# Altium footprint library ref-packages.PCBLIB: 1543 footprints (part 1 of 103)
Each footprint in its own frame and in the unit in brackets; x right, y up, seen from the top. Pads: shape width x height; smd on the part's side, far side on the other; paste and mask are expansions set on the pad; w line width, h text height; cw(c..) or ccw(c..) is an arc to the next point about the centre after c.
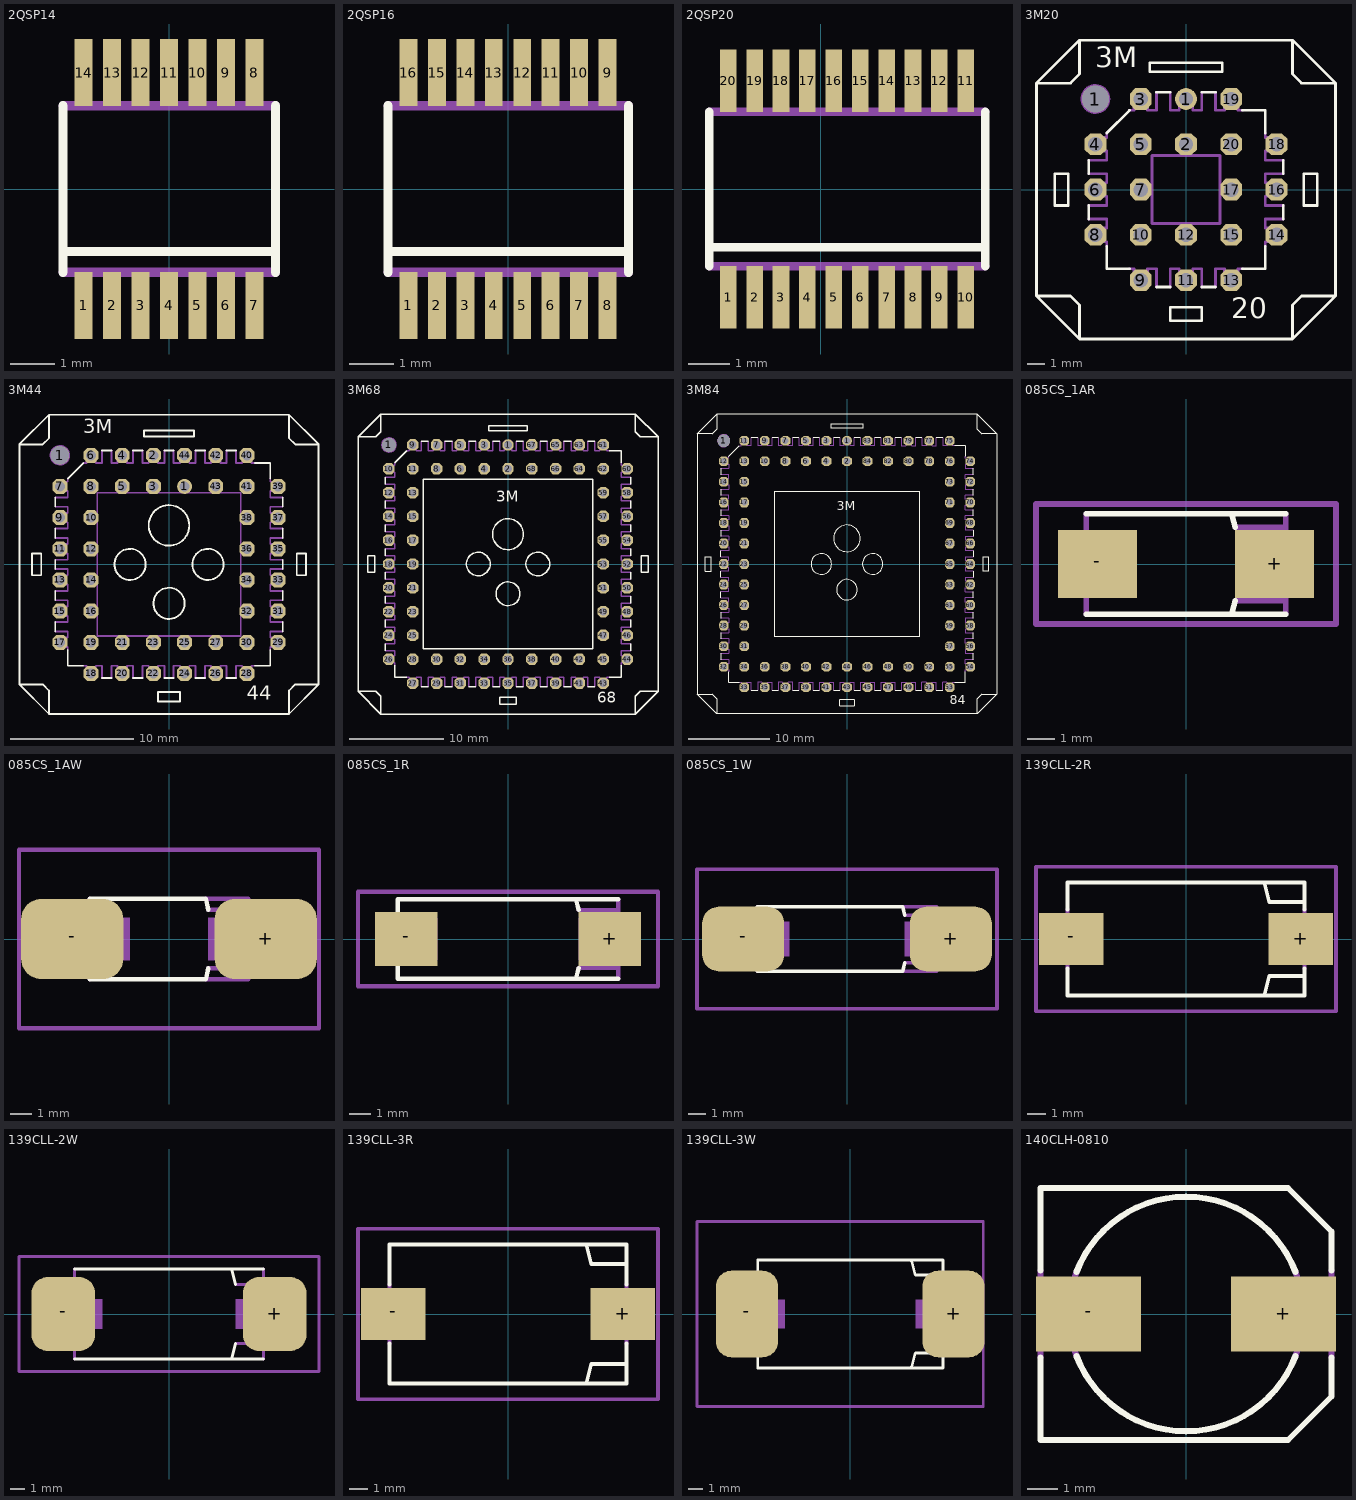
[diagram p0: the footprints below, top view; thin cyan lines are the x and y axes]

## 2QSP14 [mil]
pads (14):
  rect 15.75x59.06 smd: 1(-75,-102.36) 2(-50,-102.36) 3(-25,-102.36) 4(0,-102.36) 5(25,-102.36) 6(50,-102.36) 7(75,-102.36) 8(75,102.36) 9(50,102.36) 10(25,102.36) 11(0,102.36) 12(-25,102.36) 13(-50,102.36) 14(-75,102.36)
Top Overlay:
  lines w8: -93.11,-73.23 -93.11,73.23 ; -88.58,-55.12 90.55,-55.12 ; 93.5,-73.23 93.5,73.23
Mechanical 16:
  rectangle: -80.91,-122.05 -69.09,-74.8
  rectangle: -55.91,-122.05 -44.09,-74.8
  rectangle: -30.91,-122.05 -19.09,-74.8
  rectangle: -5.91,-122.05 5.91,-74.8
  rectangle: 19.09,-122.05 30.91,-74.8
  rectangle: 44.09,-122.05 55.91,-74.8
  rectangle: 69.09,-122.05 80.91,-74.8
  rectangle: 69.09,74.8 80.91,122.05
  rectangle: 44.09,74.8 55.91,122.05
  rectangle: 19.09,74.8 30.91,122.05
  rectangle: -5.91,74.8 5.91,122.05
  rectangle: -30.91,74.8 -19.09,122.05
  rectangle: -55.91,74.8 -44.09,122.05
  rectangle: -80.91,74.8 -69.09,122.05
  lines w8: -93.11,-73.23 93.5,-73.23 ; -93.11,73.23 93.5,73.23

## 2QSP16 [mil]
pads (16):
  rect 15.75x59.06 smd: 1(-87.52,-102.36) 2(-62.52,-102.36) 3(-37.52,-102.36) 4(-12.52,-102.36) 5(12.52,-102.36) 6(37.52,-102.36) 7(62.52,-102.36) 8(87.52,-102.36) 9(87.52,102.36) 10(62.52,102.36) 11(37.52,102.36) 12(12.52,102.36) 13(-12.52,102.36) 14(-37.52,102.36) 15(-62.52,102.36) 16(-87.52,102.36)
Top Overlay:
  lines w8: -105.63,-73.23 -105.63,73.23 ; -101.1,-55.12 103.07,-55.12 ; 106.02,-73.23 106.02,73.23
Mechanical 16:
  rectangle: -93.41,-122.05 -81.59,-74.8
  rectangle: -68.41,-122.05 -56.59,-74.8
  rectangle: -43.41,-122.05 -31.59,-74.8
  rectangle: -18.41,-122.05 -6.59,-74.8
  rectangle: 6.59,-122.05 18.41,-74.8
  rectangle: 31.59,-122.05 43.41,-74.8
  rectangle: 56.59,-122.05 68.41,-74.8
  rectangle: 81.59,-122.05 93.41,-74.8
  rectangle: 81.59,74.8 93.41,122.05
  rectangle: 56.59,74.8 68.41,122.05
  rectangle: 31.59,74.8 43.41,122.05
  rectangle: 6.59,74.8 18.41,122.05
  rectangle: -18.41,74.8 -6.59,122.05
  rectangle: -43.41,74.8 -31.59,122.05
  rectangle: -68.41,74.8 -56.59,122.05
  rectangle: -93.41,74.8 -81.59,122.05
  lines w8: -105.63,-73.23 106.02,-73.23 ; -105.63,73.23 106.02,73.23

## 2QSP20 [mil]
pads (20):
  rect 15.75x59.06 smd: 1(-87.52,-102.36) 2(-62.52,-102.36) 3(-37.52,-102.36) 4(-12.52,-102.36) 5(12.52,-102.36) 6(37.52,-102.36) 7(62.52,-102.36) 8(87.52,-102.36) 9(112.52,-102.36) 10(137.52,-102.36) 11(137.52,102.36) 12(112.52,102.36) 13(87.52,102.36) 14(62.52,102.36) 15(37.52,102.36) 16(12.52,102.36) 17(-12.52,102.36) 18(-37.52,102.36) 19(-62.52,102.36) 20(-87.52,102.36)
Top Overlay:
  lines w8: -105.63,-73.23 -105.63,73.23 ; -101.1,-55.12 153.07,-55.12 ; 156.02,-73.23 156.02,73.23
Mechanical 16:
  rectangle: -93.41,-122.05 -81.59,-74.8
  rectangle: -68.41,-122.05 -56.59,-74.8
  rectangle: -43.41,-122.05 -31.59,-74.8
  rectangle: -18.41,-122.05 -6.59,-74.8
  rectangle: 6.59,-122.05 18.41,-74.8
  rectangle: 31.59,-122.05 43.41,-74.8
  rectangle: 56.59,-122.05 68.41,-74.8
  rectangle: 81.59,-122.05 93.41,-74.8
  rectangle: 106.59,-122.05 118.41,-74.8
  rectangle: 131.59,-122.05 143.41,-74.8
  rectangle: 131.59,74.8 143.41,122.05
  rectangle: 106.59,74.8 118.41,122.05
  rectangle: 81.59,74.8 93.41,122.05
  rectangle: 56.59,74.8 68.41,122.05
  rectangle: 31.59,74.8 43.41,122.05
  rectangle: 6.59,74.8 18.41,122.05
  rectangle: -18.41,74.8 -6.59,122.05
  rectangle: -43.41,74.8 -31.59,122.05
  rectangle: -68.41,74.8 -56.59,122.05
  rectangle: -93.41,74.8 -81.59,122.05
  lines w8: -105.63,-73.23 156.02,-73.23 ; -105.63,73.23 156.02,73.23

## 3M20 [mil]
pads (21):
  round 59 hole 59: 1(-200,200)
  round 48 hole 32: 1(0,200)
  oct 48x48 hole 32: 2(0,100) 3(-100,200) 4(-200,100) 5(-100,100) 6(-200,0) 7(-100,0) 8(-200,-100) 9(-100,-200) 10(-100,-100) 11(0,-200) 12(0,-100) 13(100,-200) 14(200,-100) 15(100,-100) 16(200,0) 17(100,0) 18(200,100) 19(100,200) 20(100,100)
Top Overlay:
  lines w6: -215,-65 -215,-35 ; -215,35 -215,65 ; -175,-125 -175,-175 -125,-175 ; -175,125 -125,175 ; -65,-215 -35,-215 ; -65,215 -35,215 ; 35,-215 65,-215 ; 35,215 65,215 ; 125,-175 175,-175 175,-125 ; 125,175 175,175 175,125 ; 215,-65 215,-35 ; 215,35 215,65 ; -330,-235 -330,235 ; -330,-235 -255,-235 -235,-255 -235,-330 ; -330,-235 -235,-330 ; -330,235 -255,235 -235,255 -235,330 ; -330,235 -235,330 ; -235,-330 235,-330 ; -235,330 235,330 ; 235,-330 235,-255 255,-235 330,-235 ; 235,-330 330,-235 ; 235,330 235,255 255,235 330,235 ; 235,330 330,235 ; 330,-235 330,235 ; -290,-35 -290,35 -260,35 -260,-35 -290,-35 ; -80,260 -80,280 80,280 80,260 -80,260 ; -35,-290 -35,-260 35,-260 35,-290 -35,-290 ; 260,-35 260,35 290,35 290,-35 260,-35
  text "3M" at -200,255 h77.5
  text "20" at 100,-300 h77.5
Mechanical 16:
  circle w6: c-200,200 r30
  lines w6: -215,-65 -175,-65 -175,-85 -215,-85 -215,-115 -175,-115 -175,-125 ; -215,-35 -175,-35 -175,-15 -215,-15 -215,15 -175,15 -175,35 -215,35 ; -215,65 -175,65 -175,85 -215,85 -215,115 -175,115 -175,125 ; -125,-175 -115,-175 -115,-215 -85,-215 -85,-175 -65,-175 -65,-215 ; -125,175 -115,175 -115,215 -85,215 -85,175 -65,175 -65,215 ; -35,-215 -35,-175 -15,-175 -15,-215 15,-215 15,-175 35,-175 35,-215 ; -35,215 -35,175 -15,175 -15,215 15,215 15,175 35,175 35,215 ; 65,-215 65,-175 85,-175 85,-215 115,-215 115,-175 125,-175 ; 65,215 65,175 85,175 85,215 115,215 115,175 125,175 ; 175,-125 175,-115 215,-115 215,-85 175,-85 175,-65 215,-65 ; 175,125 175,115 215,115 215,85 175,85 175,65 215,65 ; 215,-35 175,-35 175,-15 215,-15 215,15 175,15 175,35 215,35 ; -75,-75 75,-75 75,75 -75,75 -75,-75

## 3M44 [mil]
pads (45):
  round 59 hole 59: 1(-350,350)
  round 48 hole 32: 1(50,250)
  oct 48x48 hole 32: 2(-50,350) 3(-50,250) 4(-150,350) 5(-150,250) 6(-250,350) 7(-350,250) 8(-250,250) 9(-350,150) 10(-250,150) 11(-350,50) 12(-250,50) 13(-350,-50) 14(-250,-50) 15(-350,-150) 16(-250,-150) 17(-350,-250) 18(-250,-350) 19(-250,-250) 20(-150,-350) 21(-150,-250) 22(-50,-350) 23(-50,-250) 24(50,-350) 25(50,-250) 26(150,-350) 27(150,-250) 28(250,-350) 29(350,-250) 30(250,-250) 31(350,-150) 32(250,-150) 33(350,-50) 34(250,-50) 35(350,50) 36(250,50) 37(350,150) 38(250,150) 39(350,250) 40(250,350) 41(250,250) 42(150,350) 43(150,250) 44(50,350)
Top Overlay:
  circle w6: c0,125 r65
  circle w6: c125,0 r50
  circle w6: c0,-125 r50
  circle w6: c-125,0 r50
  lines w6: -365,-215 -365,-185 ; -365,-115 -365,-85 ; -365,-15 -365,15 ; -365,85 -365,115 ; -365,185 -365,215 ; -325,-275 -325,-325 -275,-325 ; -325,275 -275,325 ; -215,-365 -185,-365 ; -215,365 -185,365 ; -115,-365 -85,-365 ; -115,365 -85,365 ; -15,-365 15,-365 ; -15,365 15,365 ; 85,-365 115,-365 ; 85,365 115,365 ; 185,-365 215,-365 ; 185,365 215,365 ; 275,-325 325,-325 325,-275 ; 275,325 325,325 325,275 ; 365,-215 365,-185 ; 365,-115 365,-85 ; 365,-15 365,15 ; 365,85 365,115 ; 365,185 365,215 ; -480,-385 -480,385 ; -480,-385 -405,-385 -385,-405 -385,-480 ; -480,-385 -385,-480 ; -480,385 -405,385 -385,405 -385,480 ; -480,385 -385,480 ; -385,-480 385,-480 ; -385,480 385,480 ; 385,-480 385,-405 405,-385 480,-385 ; 385,-480 480,-385 ; 385,480 385,405 405,385 480,385 ; 385,480 480,385 ; 480,-385 480,385 ; -440,-35 -440,35 -410,35 -410,-35 -440,-35 ; -80,410 -80,430 80,430 80,410 -80,410 ; -35,-440 -35,-410 35,-410 35,-440 -35,-440 ; 410,-35 410,35 440,35 440,-35 410,-35
  text "3M" at -275,405 h77.5
  text "44" at 250,-450 h77.5
Mechanical 16:
  drawing of 165 lines, arcs and shapes, not listed

## 3M68 [mil]
pads (69):
  round 59 hole 59: 1(-500,500)
  round 48 hole 32: 1(0,500)
  oct 48x48 hole 32: 2(0,400) 3(-100,500) 4(-100,400) 5(-200,500) 6(-200,400) 7(-300,500) 8(-300,400) 9(-400,500) 10(-500,400) 11(-400,400) 12(-500,300) 13(-400,300) 14(-500,200) 15(-400,200) 16(-500,100) 17(-400,100) 18(-500,0) 19(-400,0) 20(-500,-100) 21(-400,-100) 22(-500,-200) 23(-400,-200) 24(-500,-300) 25(-400,-300) 26(-500,-400) 27(-400,-500) 28(-400,-400) 29(-300,-500) 30(-300,-400) 31(-200,-500) 32(-200,-400) 33(-100,-500) 34(-100,-400) 35(0,-500) 36(0,-400) 37(100,-500) 38(100,-400) 39(200,-500) 40(200,-400) 41(300,-500) 42(300,-400) 43(400,-500) 44(500,-400) 45(400,-400) 46(500,-300) 47(400,-300) 48(500,-200) 49(400,-200) 50(500,-100) 51(400,-100) 52(500,0) 53(400,0) 54(500,100) 55(400,100) 56(500,200) 57(400,200) 58(500,300) 59(400,300) 60(500,400) 61(400,500) 62(400,400) 63(300,500) 64(300,400) 65(200,500) 66(200,400) 67(100,500) 68(100,400)
Top Overlay:
  circle w6: c0,125 r65
  circle w6: c125,0 r50
  circle w6: c0,-125 r50
  circle w6: c-125,0 r50
  lines w6: -515,-365 -515,-335 ; -515,-265 -515,-235 ; -515,-165 -515,-135 ; -515,-65 -515,-35 ; -515,35 -515,65 ; -515,135 -515,165 ; -515,235 -515,265 ; -515,335 -515,365 ; -475,-425 -475,-475 -425,-475 ; -475,425 -425,475 ; -365,-515 -335,-515 ; -365,515 -335,515 ; -265,-515 -235,-515 ; -265,515 -235,515 ; -165,-515 -135,-515 ; -165,515 -135,515 ; -65,-515 -35,-515 ; -65,515 -35,515 ; 35,-515 65,-515 ; 35,515 65,515 ; 135,-515 165,-515 ; 135,515 165,515 ; 235,-515 265,-515 ; 235,515 265,515 ; 335,-515 365,-515 ; 335,515 365,515 ; 425,-475 475,-475 475,-425 ; 425,475 475,475 475,425 ; 515,-365 515,-335 ; 515,-265 515,-235 ; 515,-165 515,-135 ; 515,-65 515,-35 ; 515,35 515,65 ; 515,135 515,165 ; 515,235 515,265 ; 515,335 515,365 ; -630,-535 -630,535 ; -630,-535 -555,-535 -535,-555 -535,-630 ; -630,-535 -535,-630 ; -630,535 -555,535 -535,555 -535,630 ; -630,535 -535,630 ; -535,-630 535,-630 ; -535,630 535,630 ; 535,-630 535,-555 555,-535 630,-535 ; 535,-630 630,-535 ; 535,630 535,555 555,535 630,535 ; 535,630 630,535 ; 630,-535 630,535 ; -590,-35 -590,35 -560,35 -560,-35 -590,-35 ; -355,-355 -355,355 355,355 355,-355 -355,-355 ; -80,560 -80,580 80,580 80,560 -80,560 ; -35,-590 -35,-560 35,-560 35,-590 -35,-590 ; 560,-35 560,35 590,35 590,-35 560,-35
  text "3M" at -50,245 h77.5
  text "68" at 375,-600 h77.5
Mechanical 16:
  drawing of 245 lines, arcs and shapes, not listed

## 3M84 [mil]
pads (85):
  round 59 hole 59: 1(-600,600)
  round 48 hole 32: 1(0,600)
  oct 48x48 hole 32: 2(0,500) 3(-100,600) 4(-100,500) 5(-200,600) 6(-200,500) 7(-300,600) 8(-300,500) 9(-400,600) 10(-400,500) 11(-500,600) 12(-600,500) 13(-500,500) 14(-600,400) 15(-500,400) 16(-600,300) 17(-500,300) 18(-600,200) 19(-500,200) 20(-600,100) 21(-500,100) 22(-600,0) 23(-500,0) 24(-600,-100) 25(-500,-100) 26(-600,-200) 27(-500,-200) 28(-600,-300) 29(-500,-300) 30(-600,-400) 31(-500,-400) 32(-600,-500) 33(-500,-600) 34(-500,-500) 35(-400,-600) 36(-400,-500) 37(-300,-600) 38(-300,-500) 39(-200,-600) 40(-200,-500) 41(-100,-600) 42(-100,-500) 43(0,-600) 44(0,-500) 45(100,-600) 46(100,-500) 47(200,-600) 48(200,-500) 49(300,-600) 50(300,-500) 51(400,-600) 52(400,-500) 53(500,-600) 54(600,-500) 55(500,-500) 56(600,-400) 57(500,-400) 58(600,-300) 59(500,-300) 60(600,-200) 61(500,-200) 62(600,-100) 63(500,-100) 64(600,0) 65(500,0) 66(600,100) 67(500,100) 68(600,200) 69(500,200) 70(600,300) 71(500,300) 72(600,400) 73(500,400) 74(600,500) 75(500,600) 76(500,500) 77(400,600) 78(400,500) 79(300,600) 80(300,500) 81(200,600) 82(200,500) 83(100,600) 84(100,500)
Top Overlay:
  circle w6: c0,125 r65
  circle w6: c125,0 r50
  circle w6: c0,-125 r50
  circle w6: c-125,0 r50
  lines w6: -615,-465 -615,-435 ; -615,-365 -615,-335 ; -615,-265 -615,-235 ; -615,-165 -615,-135 ; -615,-65 -615,-35 ; -615,35 -615,65 ; -615,135 -615,165 ; -615,235 -615,265 ; -615,335 -615,365 ; -615,435 -615,465 ; -575,-525 -575,-575 -525,-575 ; -575,525 -525,575 ; -465,-615 -435,-615 ; -465,615 -435,615 ; -365,-615 -335,-615 ; -365,615 -335,615 ; -265,-615 -235,-615 ; -265,615 -235,615 ; -165,-615 -135,-615 ; -165,615 -135,615 ; -65,-615 -35,-615 ; -65,615 -35,615 ; 35,-615 65,-615 ; 35,615 65,615 ; 135,-615 165,-615 ; 135,615 165,615 ; 235,-615 265,-615 ; 235,615 265,615 ; 335,-615 365,-615 ; 335,615 365,615 ; 435,-615 465,-615 ; 435,615 465,615 ; 525,-575 575,-575 575,-525 ; 525,575 575,575 575,525 ; 615,-465 615,-435 ; 615,-365 615,-335 ; 615,-265 615,-235 ; 615,-165 615,-135 ; 615,-65 615,-35 ; 615,35 615,65 ; 615,135 615,165 ; 615,235 615,265 ; 615,335 615,365 ; 615,435 615,465 ; -730,-635 -730,635 ; -730,-635 -655,-635 -635,-655 -635,-730 ; -730,-635 -635,-730 ; -730,635 -655,635 -635,655 -635,730 ; -730,635 -635,730 ; -635,-730 635,-730 ; -635,730 635,730 ; 635,-730 635,-655 655,-635 730,-635 ; 635,-730 730,-635 ; 635,730 635,655 655,635 730,635 ; 635,730 730,635 ; 730,-635 730,635 ; -690,-35 -690,35 -660,35 -660,-35 -690,-35 ; -355,-355 -355,355 355,355 355,-355 -355,-355 ; -80,660 -80,680 80,680 80,660 -80,660 ; -35,-690 -35,-660 35,-660 35,-690 -35,-690 ; 660,-35 660,35 690,35 690,-35 660,-35
  text "3M" at -50,245 h77.5
  text "84" at 500,-700 h77.5
Mechanical 16:
  drawing of 301 lines, arcs and shapes, not listed

## 085CS_1AR [mil]
pads (2):
  rect 114.17x98.43 smd: +(127.95,0) -(-127.95,0)
Top Overlay:
  lines w8: -143.7,-72.83 143.7,-72.83 ; -143.7,72.83 143.7,72.83 ; 66.93,-68.9 70.87,-53.15 ; 66.93,68.9 70.87,53.15
Mechanical 16:
  rectangle: 70.87,-39.37 163.39,39.37
  rectangle: -163.39,-39.37 -70.87,39.37
  lines w4: -175.2,-27.56 -175.2,27.56 -165.35,37.4 -165.35,-37.4 -175.2,-27.56 ; 165.35,-37.4 175.2,-27.56 175.2,27.56 165.35,37.4 165.35,-37.4
  lines w8: -169.29,-29.53 -169.29,29.53 ; -143.7,-72.83 -143.7,72.83 ; 70.87,-53.15 141.73,-53.15 ; 70.87,53.15 139.76,53.15 ; 143.7,-72.83 143.7,72.83 ; 169.29,-29.53 169.29,29.53
Mechanical 27:
  lines w8: -216.54,-86.61 -216.54,86.61 216.54,86.61 216.54,-86.61 -216.54,-86.61

## 085CS_1AW [mm]
pads (2):
  rrect50% 4.7x3.7 smd: +(4.45,0) -(-4.45,0)
Top Overlay:
  lines w0.203: -3.65,-1.85 1.7,-1.85 1.8,-1.35 ; -3.65,1.85 1.7,1.85 1.8,1.35
Mechanical 16:
  rectangle: 1.8,-1 4.15,1
  rectangle: -4.15,-1 -1.8,1
  lines w0.102: -4.45,-0.7 -4.45,0.7 -4.2,0.95 -4.2,-0.95 -4.45,-0.7 ; 4.2,-0.95 4.45,-0.7 4.45,0.7 4.2,0.95 4.2,-0.95
  lines w0.203: -4.3,-0.75 -4.3,0.75 ; -3.65,-1.85 -3.65,1.85 ; 1.7,-1.85 3.65,-1.85 3.65,1.85 1.7,1.85 ; 1.8,-1.35 3.6,-1.35 ; 1.8,1.35 3.55,1.35 ; 4.3,-0.75 4.3,0.75
Mechanical 27:
  lines w0.203: -6.9,-4.1 -6.9,4.1 6.9,4.1 6.9,-4.1 -6.9,-4.1

## 085CS_1R [mil]
pads (2):
  rect 114.17x98.43 smd: +(187.01,0) -(-187.01,0)
Top Overlay:
  lines w8: 125.98,-68.9 129.92,-53.15 ; 125.98,68.9 129.92,53.15 ; 202.76,-72.83 -202.76,-72.83 -202.76,72.83 202.76,72.83
Mechanical 16:
  rectangle: 129.92,-39.37 222.44,39.37
  rectangle: -222.44,-39.37 -129.92,39.37
  lines w4: -234.25,-27.56 -234.25,27.56 -224.41,37.4 -224.41,-37.4 -234.25,-27.56 ; 224.41,-37.4 234.25,-27.56 234.25,27.56 224.41,37.4 224.41,-37.4
  lines w8: -228.35,-29.53 -228.35,29.53 ; 129.92,-53.15 200.79,-53.15 ; 129.92,53.15 198.82,53.15 ; 202.76,-72.83 202.76,72.83 ; 228.35,-29.53 228.35,29.53
Mechanical 27:
  lines w8: -275.59,-86.61 -275.59,86.61 275.59,86.61 275.59,-86.61 -275.59,-86.61

## 085CS_1W [mm]
pads (2):
  rrect50% 4.7x3.7 smd: +(5.95,0) -(-5.95,0)
Top Overlay:
  lines w0.203: -5.15,-1.85 3.2,-1.85 3.3,-1.35 ; -5.15,1.85 3.2,1.85 3.3,1.35
Mechanical 16:
  rectangle: 3.3,-1 5.65,1
  rectangle: -5.65,-1 -3.3,1
  lines w0.102: -5.95,-0.7 -5.95,0.7 -5.7,0.95 -5.7,-0.95 -5.95,-0.7 ; 5.7,-0.95 5.95,-0.7 5.95,0.7 5.7,0.95 5.7,-0.95
  lines w0.203: -5.8,-0.75 -5.8,0.75 ; -5.15,-1.85 -5.15,1.85 ; 3.2,-1.85 5.15,-1.85 5.15,1.85 3.2,1.85 ; 3.3,-1.35 5.1,-1.35 ; 3.3,1.35 5.05,1.35 ; 5.8,-0.75 5.8,0.75
Mechanical 27:
  lines w0.203: -8.6,-4 -8.6,4 8.6,4 8.6,-4 -8.6,-4

## 139CLL-2R [mil]
pads (2):
  rect 137.8x110.24 smd: +(244.09,0) -(-244.09,0)
Top Overlay:
  lines w8: -251.97,-62.99 -251.97,-120.08 251.97,-120.08 251.97,-62.99 ; -251.97,62.99 -251.97,120.08 251.97,120.08 251.97,62.99 ; 167.32,-116.14 177.17,-78.74 250,-78.74 ; 167.32,116.14 177.17,78.74 250,78.74
Mechanical 16:
  rectangle: 177.17,-39.37 269.69,39.37
  rectangle: -269.69,-39.37 -177.17,39.37
  lines w8: -251.97,-62.99 -251.97,62.99 ; 251.97,-62.99 251.97,62.99
  lines w10: -281.5,-23.62 -271.65,-33.46 -271.65,33.46 -281.5,23.62 -281.5,-23.62 ; 271.65,-33.46 281.5,-23.62 281.5,23.62 271.65,33.46 271.65,-33.46
Mechanical 27:
  lines w8: -318.9,-153.54 -318.9,153.54 318.9,153.54 318.9,-153.54 -318.9,-153.54

## 139CLL-2W [mil]
pads (2):
  rrect50% 169.29x196.85 smd: +(281.5,0) -(-281.5,0)
Top Overlay:
  lines w8: -251.97,-120.08 251.97,-120.08 ; -251.97,120.08 251.97,120.08 ; 167.32,-116.14 177.17,-78.74 ; 167.32,116.14 177.17,78.74
Mechanical 16:
  rectangle: 177.17,-39.37 269.69,39.37
  rectangle: -269.69,-39.37 -177.17,39.37
  lines w8: -251.97,-120.08 -251.97,120.08 ; 177.17,-78.74 250,-78.74 ; 177.17,78.74 250,78.74 ; 251.97,-120.08 251.97,120.08
  lines w10: -281.5,-23.62 -271.65,-33.46 -271.65,33.46 -281.5,23.62 -281.5,-23.62 ; 271.65,-33.46 281.5,-23.62 281.5,23.62 271.65,33.46 271.65,-33.46
Mechanical 27:
  lines w8: -399.61,-153.54 -399.61,153.54 399.61,153.54 399.61,-153.54 -399.61,-153.54

## 139CLL-3R [mil]
pads (2):
  rect 137.8x110.24 smd: +(244.09,0) -(-244.09,0)
Top Overlay:
  lines w8: -251.97,-62.99 -251.97,-147.64 251.97,-147.64 251.97,-62.99 ; -251.97,62.99 -251.97,147.64 251.97,147.64 251.97,62.99 ; 167.32,-143.7 177.17,-106.3 250,-106.3 ; 167.32,143.7 177.17,106.3 250,106.3
Mechanical 16:
  rectangle: 177.17,-39.37 269.69,39.37
  rectangle: -269.69,-39.37 -177.17,39.37
  lines w8: -251.97,-62.99 -251.97,62.99 ; 251.97,-62.99 251.97,62.99
  lines w10: -281.5,-23.62 -271.65,-33.46 -271.65,33.46 -281.5,23.62 -281.5,-23.62 ; 271.65,-33.46 281.5,-23.62 281.5,23.62 271.65,33.46 271.65,-33.46
Mechanical 27:
  lines w8: -318.9,-181.1 -318.9,181.1 318.9,181.1 318.9,-181.1 -318.9,-181.1

## 139CLL-3W [mil]
pads (2):
  rrect50% 169.29x236.22 smd: +(281.5,0) -(-281.5,0)
Top Overlay:
  lines w8: -251.97,-62.99 -251.97,-147.64 251.97,-147.64 251.97,-62.99 ; -251.97,62.99 -251.97,147.64 251.97,147.64 251.97,62.99 ; 167.32,-143.7 177.17,-106.3 250,-106.3 ; 167.32,143.7 177.17,106.3 250,106.3
Mechanical 16:
  rectangle: 177.17,-39.37 269.69,39.37
  rectangle: -269.69,-39.37 -177.17,39.37
  lines w8: -251.97,-62.99 -251.97,62.99 ; 251.97,-62.99 251.97,62.99
  lines w10: -281.5,-23.62 -271.65,-33.46 -271.65,33.46 -281.5,23.62 -281.5,-23.62 ; 271.65,-33.46 281.5,-23.62 281.5,23.62 271.65,33.46 271.65,-33.46
Mechanical 27:
  lines w8: -417.32,-251.97 -417.32,251.97 362.2,251.97 362.2,-251.97 -417.32,-251.97

## 140CLH-0810 [mil]
pads (2):
  rect 137.8x98.43 smd: +(127.95,0) -(-127.95,0)
Top Overlay:
  lines w8: -190.94,-57.09 -190.94,-165.35 133.86,-165.35 190.94,-108.27 190.94,-57.09 ; -190.94,57.09 -190.94,165.35 133.86,165.35 190.94,108.27 190.94,57.09 ; -143.7,-55.12 ccw(c0,0) 143.7,-55.12 ; -143.7,55.12 cw(c0,0) 143.7,55.12
Mechanical 16:
  lines w8: -190.94,-57.09 -190.94,57.09 ; -143.7,-55.12 cw(c0.01,0) -143.7,55.12 ; 143.7,-55.12 ccw(c-0.01,0) 143.7,55.12 ; 190.94,-57.09 190.94,57.09